# Altium schematic symbol library jlcpcb_2025_04_capacitors_extended_1210.schlib: 709 symbols (part 1 of 4) (continued)
## 12105C225KAT2A
designator C?  Capacitance: 2.2uF  (hidden comment: *)
Capacitor, Ceramic (MLCC), 2.2uF, ±10%, 50V, X7R, ±10%, SMD 1210; Manufacturer: AVX; Manufacturer Part Number: 12105C225KAT2A; Package Size: 1210; JLCPCB Basic Part: No; JLCPCB Part Number: C597581; Supplier 1: LCSC; Category: Capacitors - MLCC; Supplier Part Number 1: C597581; Tolerance: ±10%; Voltage Rating: 50V; Temperature Coefficient: X7R; RoHS: Yes; ComponentLink1Description: Datasheet; ComponentLink1URL: https://wmsc.lcsc.com/wmsc/upload/file/pdf/v2/lcsc/2304140030_Kyocera-AVX-12105C225KAT2A_C597581.pdf; ComponentLink2Description: JLCPCB Part URL; ComponentLink2URL: https://jlcpcb.com/partdetail/C597581; ComponentLink3Description: LCSC Part URL; ComponentLink3URL: https://lcsc.com/product-detail/Multilayer-Ceramic-Capacitors-MLCC---SMD-SMT_Kyocera-AVX-Kyocera-AVX-12105C225KAT2A_C597581.html
footprint CAP-1210 (1210 (3225M) Capacitor)
pins: 1, 2

## 12105C475KAT2A
designator C?  Capacitance: 4.7uF  (hidden comment: *)
Capacitor, Ceramic (MLCC), 4.7uF, ±10%, 50V, X7R, ±10%, SMD 1210; Manufacturer: AVX; Manufacturer Part Number: 12105C475KAT2A; Package Size: 1210; JLCPCB Basic Part: No; JLCPCB Part Number: C597589; Supplier 1: LCSC; Category: Capacitors - MLCC; Supplier Part Number 1: C597589; Tolerance: ±10%; Voltage Rating: 50V; Temperature Coefficient: X7R; RoHS: Yes; ComponentLink1Description: Datasheet; ComponentLink1URL: https://wmsc.lcsc.com/wmsc/upload/file/pdf/v2/lcsc/2304140030_Kyocera-AVX-12105C475KAT2A_C597589.pdf; ComponentLink2Description: JLCPCB Part URL; ComponentLink2URL: https://jlcpcb.com/partdetail/C597589; ComponentLink3Description: LCSC Part URL; ComponentLink3URL: https://lcsc.com/product-detail/Multilayer-Ceramic-Capacitors-MLCC---SMD-SMT_Kyocera-AVX-Kyocera-AVX-12105C475KAT2A_C597589.html
footprint CAP-1210 (1210 (3225M) Capacitor)
pins: 1, 2

## 12106D476KAT2A
designator C?  Capacitance: 47uF  (hidden comment: *)
Capacitor, Ceramic (MLCC), 47uF, ±10%, 6.3V, X5R, ±10%, SMD 1210; Manufacturer: AVX; Manufacturer Part Number: 12106D476KAT2A; Package Size: 1210; JLCPCB Basic Part: No; JLCPCB Part Number: C597592; Supplier 1: LCSC; Category: Capacitors - MLCC; Supplier Part Number 1: C597592; Tolerance: ±10%; Voltage Rating: 6.3V; Temperature Coefficient: X5R; RoHS: Yes; ComponentLink1Description: Datasheet; ComponentLink1URL: https://wmsc.lcsc.com/wmsc/upload/file/pdf/v2/lcsc/2304140030_Kyocera-AVX-12106D476KAT2A_C597592.pdf; ComponentLink2Description: JLCPCB Part URL; ComponentLink2URL: https://jlcpcb.com/partdetail/C597592; ComponentLink3Description: LCSC Part URL; ComponentLink3URL: https://lcsc.com/product-detail/Multilayer-Ceramic-Capacitors-MLCC---SMD-SMT_Kyocera-AVX-Kyocera-AVX-12106D476KAT2A_C597592.html
footprint CAP-1210 (1210 (3225M) Capacitor)
pins: 1, 2

## AC1210JKNPO9BN102
designator C?  Capacitance: 1nF  (hidden comment: *)
Capacitor, Ceramic (MLCC), 1nF, ±5%, 50V, NP0, ±5%, SMD 1210; Manufacturer: YAGEO; Manufacturer Part Number: AC1210JKNPO9BN102; Package Size: 1210; JLCPCB Basic Part: No; JLCPCB Part Number: C2173372; Supplier 1: LCSC; Category: Capacitors - MLCC; Supplier Part Number 1: C2173372; Tolerance: ±5%; Voltage Rating: 50V; Temperature Coefficient: NP0; RoHS: Yes; ComponentLink1Description: Datasheet; ComponentLink1URL: https://wmsc.lcsc.com/wmsc/upload/file/pdf/v2/lcsc/2202040630_YAGEO-AC1210JKNPO9BN102_C2173372.pdf; ComponentLink2Description: JLCPCB Part URL; ComponentLink2URL: https://jlcpcb.com/partdetail/C2173372; ComponentLink3Description: LCSC Part URL; ComponentLink3URL: https://lcsc.com/product-detail/Multilayer-Ceramic-Capacitors-MLCC---SMD-SMT_YAGEO-YAGEO-AC1210JKNPO9BN102_C2173372.html
footprint CAP-1210 (1210 (3225M) Capacitor)
pins: 1, 2

## AC1210JKNPOYBN102
designator C?  Capacitance: 1nF  (hidden comment: *)
Capacitor, Ceramic (MLCC), 1nF, ±5%, 250V, NP0, ±5%, SMD 1210; Manufacturer: YAGEO; Manufacturer Part Number: AC1210JKNPOYBN102; Package Size: 1210; JLCPCB Basic Part: No; JLCPCB Part Number: C2179434; Supplier 1: LCSC; Category: Capacitors - MLCC; Supplier Part Number 1: C2179434; Tolerance: ±5%; Voltage Rating: 250V; Temperature Coefficient: NP0; RoHS: Yes; ComponentLink1Description: Datasheet; ComponentLink1URL: https://wmsc.lcsc.com/wmsc/upload/file/pdf/v2/lcsc/2202041030_YAGEO-AC1210JKNPOYBN102_C2179434.pdf; ComponentLink2Description: JLCPCB Part URL; ComponentLink2URL: https://jlcpcb.com/partdetail/C2179434; ComponentLink3Description: LCSC Part URL; ComponentLink3URL: https://lcsc.com/product-detail/Multilayer-Ceramic-Capacitors-MLCC---SMD-SMT_YAGEO-YAGEO-AC1210JKNPOYBN102_C2179434.html
footprint CAP-1210 (1210 (3225M) Capacitor)
pins: 1, 2

## AC1210KKX7R0BB104
designator C?  Capacitance: 100nF  (hidden comment: *)
Capacitor, Ceramic (MLCC), 100nF, ±10%, 100V, X7R, ±10%, SMD 1210; Manufacturer: YAGEO; Manufacturer Part Number: AC1210KKX7R0BB104; Package Size: 1210; JLCPCB Basic Part: No; JLCPCB Part Number: C3861426; Supplier 1: LCSC; Category: Capacitors - MLCC; Supplier Part Number 1: C3861426; Tolerance: ±10%; Voltage Rating: 100V; Temperature Coefficient: X7R; RoHS: Yes; ComponentLink1Description: Datasheet; ComponentLink1URL: https://wmsc.lcsc.com/wmsc/upload/file/pdf/v2/lcsc/2311211113_YAGEO-AC1210KKX7R0BB104_C3861426.pdf; ComponentLink2Description: JLCPCB Part URL; ComponentLink2URL: https://jlcpcb.com/partdetail/C3861426; ComponentLink3Description: LCSC Part URL; ComponentLink3URL: https://lcsc.com/product-detail/Multilayer-Ceramic-Capacitors-MLCC---SMD-SMT_YAGEO-YAGEO-AC1210KKX7R0BB104_C3861426.html
footprint CAP-1210 (1210 (3225M) Capacitor)
pins: 1, 2

## AC1210KKX7R9BB474
designator C?  Capacitance: 470nF  (hidden comment: *)
Capacitor, Ceramic (MLCC), 470nF, ±10%, 50V, X7R, ±10%, SMD 1210; Manufacturer: YAGEO; Manufacturer Part Number: AC1210KKX7R9BB474; Package Size: 1210; JLCPCB Basic Part: No; JLCPCB Part Number: C2173617; Supplier 1: LCSC; Category: Capacitors - MLCC; Supplier Part Number 1: C2173617; Tolerance: ±10%; Voltage Rating: 50V; Temperature Coefficient: X7R; RoHS: Yes; ComponentLink1Description: Datasheet; ComponentLink1URL: https://wmsc.lcsc.com/wmsc/upload/file/pdf/v2/lcsc/2202040630_YAGEO-AC1210KKX7R9BB474_C2173617.pdf; ComponentLink2Description: JLCPCB Part URL; ComponentLink2URL: https://jlcpcb.com/partdetail/C2173617; ComponentLink3Description: LCSC Part URL; ComponentLink3URL: https://lcsc.com/product-detail/Multilayer-Ceramic-Capacitors-MLCC---SMD-SMT_YAGEO-YAGEO-AC1210KKX7R9BB474_C2173617.html
footprint CAP-1210 (1210 (3225M) Capacitor)
pins: 1, 2

## AC1210KKX7R9BB475
designator C?  Capacitance: 4.7uF  (hidden comment: *)
Capacitor, Ceramic (MLCC), 4.7uF, ±10%, 50V, X7R, ±10%, SMD 1210; Manufacturer: YAGEO; Manufacturer Part Number: AC1210KKX7R9BB475; Package Size: 1210; JLCPCB Basic Part: No; JLCPCB Part Number: C2935250; Supplier 1: LCSC; Category: Capacitors - MLCC; Supplier Part Number 1: C2935250; Tolerance: ±10%; Voltage Rating: 50V; Temperature Coefficient: X7R; RoHS: Yes; ComponentLink1Description: Datasheet; ComponentLink1URL: https://wmsc.lcsc.com/wmsc/upload/file/pdf/v2/lcsc/2203101903_YAGEO-AC1210KKX7R9BB475_C2935250.pdf; ComponentLink2Description: JLCPCB Part URL; ComponentLink2URL: https://jlcpcb.com/partdetail/C2935250; ComponentLink3Description: LCSC Part URL; ComponentLink3URL: https://lcsc.com/product-detail/Multilayer-Ceramic-Capacitors-MLCC---SMD-SMT_YAGEO-YAGEO-AC1210KKX7R9BB475_C2935250.html
footprint CAP-1210 (1210 (3225M) Capacitor)
pins: 1, 2

## AS1210KKX7R9BB475
designator C?  Capacitance: 4.7uF  (hidden comment: *)
Capacitor, Ceramic (MLCC), 4.7uF, ±10%, 50V, X7R, ±10%, SMD 1210; Manufacturer: YAGEO; Manufacturer Part Number: AS1210KKX7R9BB475; Package Size: 1210; JLCPCB Basic Part: No; JLCPCB Part Number: C2168507; Supplier 1: LCSC; Category: Capacitors - MLCC; Supplier Part Number 1: C2168507; Tolerance: ±10%; Voltage Rating: 50V; Temperature Coefficient: X7R; RoHS: Yes; ComponentLink1Description: Datasheet; ComponentLink1URL: https://wmsc.lcsc.com/wmsc/upload/file/pdf/v2/lcsc/2202040300_YAGEO-AS1210KKX7R9BB475_C2168507.pdf; ComponentLink2Description: JLCPCB Part URL; ComponentLink2URL: https://jlcpcb.com/partdetail/C2168507; ComponentLink3Description: LCSC Part URL; ComponentLink3URL: https://lcsc.com/product-detail/Multilayer-Ceramic-Capacitors-MLCC---SMD-SMT_YAGEO-YAGEO-AS1210KKX7R9BB475_C2168507.html
footprint CAP-1210 (1210 (3225M) Capacitor)
pins: 1, 2

## C1210B106K025T
designator C?  Capacitance: 10uF  (hidden comment: *)
Capacitor, Ceramic (MLCC), 10uF, ±10%, 25V, X5R, ±10%, SMD 1210; Manufacturer: IHHEC(HOLY STONE ENTERPRISE CO., LTD); Manufacturer Part Number: C1210B106K025T; Package Size: 1210; JLCPCB Basic Part: No; JLCPCB Part Number: C106092; Supplier 1: LCSC; Category: Capacitors - MLCC; Supplier Part Number 1: C106092; Tolerance: ±10%; Voltage Rating: 25V; Temperature Coefficient: X5R; RoHS: Yes; ComponentLink1Description: Datasheet; ComponentLink1URL: https://wmsc.lcsc.com/wmsc/upload/file/pdf/v2/lcsc/2304140030_IHHEC-HOLY-STONE-ENTERPRISE-CO---LTD-C1210B106K025T_C106092.pdf; ComponentLink2Description: JLCPCB Part URL; ComponentLink2URL: https://jlcpcb.com/partdetail/C106092; ComponentLink3Description: LCSC Part URL; ComponentLink3URL: https://lcsc.com/product-detail/Multilayer-Ceramic-Capacitors-MLCC---SMD-SMT_IHHECHOLY-STONE-ENTERPRISE-CO.%2C-LTD-IHHECHOLY-STONE-ENTERPRISE-CO.%2C-LTD-C1210B106K025T_C106092.html
footprint CAP-1210 (1210 (3225M) Capacitor)
pins: 1, 2

## C1210C104KCRAC7800
designator C?  Capacitance: 100nF  (hidden comment: *)
Capacitor, Ceramic (MLCC), 100nF, ±10%, 500V, X7R, ±10%, SMD 1210; Manufacturer: KEMET; Manufacturer Part Number: C1210C104KCRAC7800; Package Size: 1210; JLCPCB Basic Part: No; JLCPCB Part Number: C141218; Supplier 1: LCSC; Category: Capacitors - MLCC; Supplier Part Number 1: C141218; Tolerance: ±10%; Voltage Rating: 500V; Temperature Coefficient: X7R; RoHS: Yes; ComponentLink1Description: Datasheet; ComponentLink1URL: https://wmsc.lcsc.com/wmsc/upload/file/pdf/v2/lcsc/1809031721_KEMET-C1210C104KCRAC7800_C141218.pdf; ComponentLink2Description: JLCPCB Part URL; ComponentLink2URL: https://jlcpcb.com/partdetail/C141218; ComponentLink3Description: LCSC Part URL; ComponentLink3URL: https://lcsc.com/product-detail/Multilayer-Ceramic-Capacitors-MLCC---SMD-SMT_KEMET-KEMET-C1210C104KCRAC7800_C141218.html
footprint CAP-1210 (1210 (3225M) Capacitor)
pins: 1, 2

## C1210C105K1RACAUTO
designator C?  Capacitance: 1uF  (hidden comment: *)
Capacitor, Ceramic (MLCC), 1uF, ±10%, 100V, X7R, ±10%, SMD 1210; Manufacturer: KEMET; Manufacturer Part Number: C1210C105K1RACAUTO; Package Size: 1210; JLCPCB Basic Part: No; JLCPCB Part Number: C129676; Supplier 1: LCSC; Category: Capacitors - MLCC; Supplier Part Number 1: C129676; Tolerance: ±10%; Voltage Rating: 100V; Temperature Coefficient: X7R; RoHS: Yes; ComponentLink1Description: Datasheet; ComponentLink1URL: https://wmsc.lcsc.com/wmsc/upload/file/pdf/v2/lcsc/2304140030_KEMET-C1210C105K1RACAUTO_C129676.pdf; ComponentLink2Description: JLCPCB Part URL; ComponentLink2URL: https://jlcpcb.com/partdetail/C129676; ComponentLink3Description: LCSC Part URL; ComponentLink3URL: https://lcsc.com/product-detail/Multilayer-Ceramic-Capacitors-MLCC---SMD-SMT_KEMET-KEMET-C1210C105K1RACAUTO_C129676.html
footprint CAP-1210 (1210 (3225M) Capacitor)
pins: 1, 2

## C1210C105K5RAC7800
designator C?  Capacitance: 1uF  (hidden comment: *)
Capacitor, Ceramic (MLCC), 1uF, ±10%, 50V, X7R, ±10%, SMD 1210; Manufacturer: KEMET; Manufacturer Part Number: C1210C105K5RAC7800; Package Size: 1210; JLCPCB Basic Part: No; JLCPCB Part Number: C141220; Supplier 1: LCSC; Category: Capacitors - MLCC; Supplier Part Number 1: C141220; Tolerance: ±10%; Voltage Rating: 50V; Temperature Coefficient: X7R; RoHS: Yes; ComponentLink1Description: Datasheet; ComponentLink1URL: https://wmsc.lcsc.com/wmsc/upload/file/pdf/v2/lcsc/2304140030_KEMET-C1210C105K5RAC7800_C141220.pdf; ComponentLink2Description: JLCPCB Part URL; ComponentLink2URL: https://jlcpcb.com/partdetail/C141220; ComponentLink3Description: LCSC Part URL; ComponentLink3URL: https://lcsc.com/product-detail/Multilayer-Ceramic-Capacitors-MLCC---SMD-SMT_KEMET-KEMET-C1210C105K5RAC7800_C141220.html
footprint CAP-1210 (1210 (3225M) Capacitor)
pins: 1, 2

## C1210C106K3RACAUTO
designator C?  Capacitance: 10uF  (hidden comment: *)
Capacitor, Ceramic (MLCC), 10uF, ±10%, 25V, X7R, ±10%, SMD 1210; Manufacturer: KEMET; Manufacturer Part Number: C1210C106K3RACAUTO; Package Size: 1210; JLCPCB Basic Part: No; JLCPCB Part Number: C129691; Supplier 1: LCSC; Category: Capacitors - MLCC; Supplier Part Number 1: C129691; Tolerance: ±10%; Voltage Rating: 25V; Temperature Coefficient: X7R; RoHS: Yes; ComponentLink1Description: Datasheet; ComponentLink1URL: https://wmsc.lcsc.com/wmsc/upload/file/pdf/v2/lcsc/1804242310_KEMET-C1210C106K3RACAUTO_C129691.pdf; ComponentLink2Description: JLCPCB Part URL; ComponentLink2URL: https://jlcpcb.com/partdetail/C129691; ComponentLink3Description: LCSC Part URL; ComponentLink3URL: https://lcsc.com/product-detail/Multilayer-Ceramic-Capacitors-MLCC---SMD-SMT_KEMET-KEMET-C1210C106K3RACAUTO_C129691.html
footprint CAP-1210 (1210 (3225M) Capacitor)
pins: 1, 2

## C1210C222JDGACAUTO
designator C?  Capacitance: 2.2nF  (hidden comment: *)
Capacitor, Ceramic (MLCC), 2.2nF, ±5%, 1kV, C0G, ±5%, SMD 1210; Manufacturer: KEMET; Manufacturer Part Number: C1210C222JDGACAUTO; Package Size: 1210; JLCPCB Basic Part: No; JLCPCB Part Number: C2181686; Supplier 1: LCSC; Category: Capacitors - MLCC; Supplier Part Number 1: C2181686; Tolerance: ±5%; Voltage Rating: 1kV; Temperature Coefficient: C0G; RoHS: Yes; ComponentLink1Description: Datasheet; ComponentLink1URL: https://wmsc.lcsc.com/wmsc/upload/file/pdf/v2/lcsc/2304140030_KEMET-C1210C222JDGACAUTO_C2181686.pdf; ComponentLink2Description: JLCPCB Part URL; ComponentLink2URL: https://jlcpcb.com/partdetail/C2181686; ComponentLink3Description: LCSC Part URL; ComponentLink3URL: https://lcsc.com/product-detail/Multilayer-Ceramic-Capacitors-MLCC---SMD-SMT_KEMET-KEMET-C1210C222JDGACAUTO_C2181686.html
footprint CAP-1210 (1210 (3225M) Capacitor)
pins: 1, 2

## C1210C224K5RACTU
designator C?  Capacitance: 220nF  (hidden comment: *)
Capacitor, Ceramic (MLCC), 220nF, ±10%, 50V, X7R, ±10%, SMD 1210; Manufacturer: KEMET; Manufacturer Part Number: C1210C224K5RACTU; Package Size: 1210; JLCPCB Basic Part: No; JLCPCB Part Number: C452758; Supplier 1: LCSC; Category: Capacitors - MLCC; Supplier Part Number 1: C452758; Tolerance: ±10%; Voltage Rating: 50V; Temperature Coefficient: X7R; RoHS: Yes; ComponentLink1Description: Datasheet; ComponentLink1URL: https://wmsc.lcsc.com/wmsc/upload/file/pdf/v2/lcsc/2304140030_KEMET-C1210C224K5RACTU_C452758.pdf; ComponentLink2Description: JLCPCB Part URL; ComponentLink2URL: https://jlcpcb.com/partdetail/C452758; ComponentLink3Description: LCSC Part URL; ComponentLink3URL: https://lcsc.com/product-detail/Multilayer-Ceramic-Capacitors-MLCC---SMD-SMT_KEMET-KEMET-C1210C224K5RACTU_C452758.html
footprint CAP-1210 (1210 (3225M) Capacitor)
pins: 1, 2

## C1210C225K1RACAUTO
designator C?  Capacitance: 2.2uF  (hidden comment: *)
Capacitor, Ceramic (MLCC), 2.2uF, ±10%, 100V, X7R, ±10%, SMD 1210; Manufacturer: KEMET; Manufacturer Part Number: C1210C225K1RACAUTO; Package Size: 1210; JLCPCB Basic Part: No; JLCPCB Part Number: C561798; Supplier 1: LCSC; Category: Capacitors - MLCC; Supplier Part Number 1: C561798; Tolerance: ±10%; Voltage Rating: 100V; Temperature Coefficient: X7R; RoHS: Yes; ComponentLink1Description: Datasheet; ComponentLink1URL: https://wmsc.lcsc.com/wmsc/upload/file/pdf/v2/lcsc/2304140030_KEMET-C1210C225K1RACAUTO_C561798.pdf; ComponentLink2Description: JLCPCB Part URL; ComponentLink2URL: https://jlcpcb.com/partdetail/C561798; ComponentLink3Description: LCSC Part URL; ComponentLink3URL: https://lcsc.com/product-detail/Multilayer-Ceramic-Capacitors-MLCC---SMD-SMT_KEMET-KEMET-C1210C225K1RACAUTO_C561798.html
footprint CAP-1210 (1210 (3225M) Capacitor)
pins: 1, 2

## C1210C225K5RACAUTO
designator C?  Capacitance: 2.2uF  (hidden comment: *)
Capacitor, Ceramic (MLCC), 2.2uF, ±10%, 50V, X7R, ±10%, SMD 1210; Manufacturer: KEMET; Manufacturer Part Number: C1210C225K5RACAUTO; Package Size: 1210; JLCPCB Basic Part: No; JLCPCB Part Number: C129678; Supplier 1: LCSC; Category: Capacitors - MLCC; Supplier Part Number 1: C129678; Tolerance: ±10%; Voltage Rating: 50V; Temperature Coefficient: X7R; RoHS: Yes; ComponentLink1Description: Datasheet; ComponentLink1URL: https://wmsc.lcsc.com/wmsc/upload/file/pdf/v2/lcsc/1810121647_KEMET-C1210C225K5RACAUTO_C129678.pdf; ComponentLink2Description: JLCPCB Part URL; ComponentLink2URL: https://jlcpcb.com/partdetail/C129678; ComponentLink3Description: LCSC Part URL; ComponentLink3URL: https://lcsc.com/product-detail/Multilayer-Ceramic-Capacitors-MLCC---SMD-SMT_KEMET-KEMET-C1210C225K5RACAUTO_C129678.html
footprint CAP-1210 (1210 (3225M) Capacitor)
pins: 1, 2

## C1210C226K3RAC7800
designator C?  Capacitance: 22uF  (hidden comment: *)
Capacitor, Ceramic (MLCC), 22uF, ±10%, 25V, X7R, ±10%, SMD 1210; Manufacturer: KEMET; Manufacturer Part Number: C1210C226K3RAC7800; Package Size: 1210; JLCPCB Basic Part: No; JLCPCB Part Number: C696378; Supplier 1: LCSC; Category: Capacitors - MLCC; Supplier Part Number 1: C696378; Tolerance: ±10%; Voltage Rating: 25V; Temperature Coefficient: X7R; RoHS: Yes; ComponentLink1Description: Datasheet; ComponentLink1URL: https://wmsc.lcsc.com/wmsc/upload/file/pdf/v2/lcsc/2008131833_KEMET-C1210C226K3RAC7800_C696378.pdf; ComponentLink2Description: JLCPCB Part URL; ComponentLink2URL: https://jlcpcb.com/partdetail/C696378; ComponentLink3Description: LCSC Part URL; ComponentLink3URL: https://lcsc.com/product-detail/Multilayer-Ceramic-Capacitors-MLCC---SMD-SMT_KEMET-KEMET-C1210C226K3RAC7800_C696378.html
footprint CAP-1210 (1210 (3225M) Capacitor)
pins: 1, 2

## C1210C226K4PAC7800
designator C?  Capacitance: 22uF  (hidden comment: *)
Capacitor, Ceramic (MLCC), 22uF, ±10%, 16V, X5R, ±10%, SMD 1210; Manufacturer: KEMET; Manufacturer Part Number: C1210C226K4PAC7800; Package Size: 1210; JLCPCB Basic Part: No; JLCPCB Part Number: C141048; Supplier 1: LCSC; Category: Capacitors - MLCC; Supplier Part Number 1: C141048; Tolerance: ±10%; Voltage Rating: 16V; Temperature Coefficient: X5R; RoHS: Yes; ComponentLink1Description: Datasheet; ComponentLink1URL: https://wmsc.lcsc.com/wmsc/upload/file/pdf/v2/lcsc/2304140030_KEMET-C1210C226K4PAC7800_C141048.pdf; ComponentLink2Description: JLCPCB Part URL; ComponentLink2URL: https://jlcpcb.com/partdetail/C141048; ComponentLink3Description: LCSC Part URL; ComponentLink3URL: https://lcsc.com/product-detail/Multilayer-Ceramic-Capacitors-MLCC---SMD-SMT_KEMET-KEMET-C1210C226K4PAC7800_C141048.html
footprint CAP-1210 (1210 (3225M) Capacitor)
pins: 1, 2

## C1210C226K8RACAUTO
designator C?  Capacitance: 22uF  (hidden comment: *)
Capacitor, Ceramic (MLCC), 22uF, ±10%, 10V, X7R, ±10%, SMD 1210; Manufacturer: KEMET; Manufacturer Part Number: C1210C226K8RACAUTO; Package Size: 1210; JLCPCB Basic Part: No; JLCPCB Part Number: C561843; Supplier 1: LCSC; Category: Capacitors - MLCC; Supplier Part Number 1: C561843; Tolerance: ±10%; Voltage Rating: 10V; Temperature Coefficient: X7R; RoHS: Yes; ComponentLink1Description: Datasheet; ComponentLink1URL: https://wmsc.lcsc.com/wmsc/upload/file/pdf/v2/lcsc/2304140030_KEMET-C1210C226K8RACAUTO_C561843.pdf; ComponentLink2Description: JLCPCB Part URL; ComponentLink2URL: https://jlcpcb.com/partdetail/C561843; ComponentLink3Description: LCSC Part URL; ComponentLink3URL: https://lcsc.com/product-detail/Multilayer-Ceramic-Capacitors-MLCC---SMD-SMT_KEMET-KEMET-C1210C226K8RACAUTO_C561843.html
footprint CAP-1210 (1210 (3225M) Capacitor)
pins: 1, 2

## C1210C335K5RACAUTO
designator C?  Capacitance: 3.3uF  (hidden comment: *)
Capacitor, Ceramic (MLCC), 3.3uF, ±10%, 50V, X7R, ±10%, SMD 1210; Manufacturer: KEMET; Manufacturer Part Number: C1210C335K5RACAUTO; Package Size: 1210; JLCPCB Basic Part: No; JLCPCB Part Number: C3855810; Supplier 1: LCSC; Category: Capacitors - MLCC; Supplier Part Number 1: C3855810; Tolerance: ±10%; Voltage Rating: 50V; Temperature Coefficient: X7R; RoHS: Yes; ComponentLink1Description: Datasheet; ComponentLink1URL: https://wmsc.lcsc.com/wmsc/upload/file/pdf/v2/lcsc/2401181625_KEMET-C1210C335K5RACAUTO_C3855810.pdf; ComponentLink2Description: JLCPCB Part URL; ComponentLink2URL: https://jlcpcb.com/partdetail/C3855810; ComponentLink3Description: LCSC Part URL; ComponentLink3URL: https://lcsc.com/product-detail/Multilayer-Ceramic-Capacitors-MLCC---SMD-SMT_KEMET-KEMET-C1210C335K5RACAUTO_C3855810.html
footprint CAP-1210 (1210 (3225M) Capacitor)
pins: 1, 2

## C1210C475K5RACAUTO
designator C?  Capacitance: 4.7uF  (hidden comment: *)
Capacitor, Ceramic (MLCC), 4.7uF, ±10%, 50V, X7R, ±10%, SMD 1210; Manufacturer: KEMET; Manufacturer Part Number: C1210C475K5RACAUTO; Package Size: 1210; JLCPCB Basic Part: No; JLCPCB Part Number: C141229; Supplier 1: LCSC; Category: Capacitors - MLCC; Supplier Part Number 1: C141229; Tolerance: ±10%; Voltage Rating: 50V; Temperature Coefficient: X7R; RoHS: Yes; ComponentLink1Description: Datasheet; ComponentLink1URL: https://wmsc.lcsc.com/wmsc/upload/file/pdf/v2/lcsc/1809131620_KEMET-C1210C475K5RACAUTO_C141229.pdf; ComponentLink2Description: JLCPCB Part URL; ComponentLink2URL: https://jlcpcb.com/partdetail/C141229; ComponentLink3Description: LCSC Part URL; ComponentLink3URL: https://lcsc.com/product-detail/Multilayer-Ceramic-Capacitors-MLCC---SMD-SMT_KEMET-KEMET-C1210C475K5RACAUTO_C141229.html
footprint CAP-1210 (1210 (3225M) Capacitor)
pins: 1, 2

## C1210N101J202T
designator C?  Capacitance: 100pF  (hidden comment: *)
Capacitor, Ceramic (MLCC), 100pF, ±5%, 2kV, C0G, ±5%, SMD 1210; Manufacturer: IHHEC(HOLY STONE ENTERPRISE CO., LTD); Manufacturer Part Number: C1210N101J202T; Package Size: 1210; JLCPCB Basic Part: No; JLCPCB Part Number: C106093; Supplier 1: LCSC; Category: Capacitors - MLCC; Supplier Part Number 1: C106093; Tolerance: ±5%; Voltage Rating: 2kV; Temperature Coefficient: C0G; RoHS: Yes; ComponentLink1Description: Datasheet; ComponentLink1URL: https://wmsc.lcsc.com/wmsc/upload/file/pdf/v2/lcsc/2304140030_IHHEC-HOLY-STONE-ENTERPRISE-CO---LTD-C1210N101J202T_C106093.pdf; ComponentLink2Description: JLCPCB Part URL; ComponentLink2URL: https://jlcpcb.com/partdetail/C106093; ComponentLink3Description: LCSC Part URL; ComponentLink3URL: https://lcsc.com/product-detail/Multilayer-Ceramic-Capacitors-MLCC---SMD-SMT_IHHECHOLY-STONE-ENTERPRISE-CO.%2C-LTD-IHHECHOLY-STONE-ENTERPRISE-CO.%2C-LTD-C1210N101J202T_C106093.html
footprint CAP-1210 (1210 (3225M) Capacitor)
pins: 1, 2

## C1210N102J102T
designator C?  Capacitance: 1nF  (hidden comment: *)
Capacitor, Ceramic (MLCC), 1nF, ±5%, 1kV, ±5%, SMD 1210; Manufacturer: IHHEC(HOLY STONE ENTERPRISE CO., LTD); Manufacturer Part Number: C1210N102J102T; Package Size: 1210; JLCPCB Basic Part: No; JLCPCB Part Number: C961531; Supplier 1: LCSC; Category: Capacitors - MLCC; Supplier Part Number 1: C961531; Tolerance: ±5%; Voltage Rating: 1kV; RoHS: Yes; ComponentLink1Description: Datasheet; ComponentLink1URL: https://wmsc.lcsc.com/wmsc/upload/file/pdf/v2/lcsc/2304140030_IHHEC-HOLY-STONE-ENTERPRISE-CO---LTD-C1210N102J102T_C961531.pdf; ComponentLink2Description: JLCPCB Part URL; ComponentLink2URL: https://jlcpcb.com/partdetail/C961531; ComponentLink3Description: LCSC Part URL; ComponentLink3URL: https://lcsc.com/product-detail/Multilayer-Ceramic-Capacitors-MLCC---SMD-SMT_IHHECHOLY-STONE-ENTERPRISE-CO.%2C-LTD-IHHECHOLY-STONE-ENTERPRISE-CO.%2C-LTD-C1210N102J102T_C961531.html
footprint CAP-1210 (1210 (3225M) Capacitor)
pins: 1, 2

## C1210N103K050T
designator C?  Capacitance: 10nF  (hidden comment: *)
Capacitor, Ceramic (MLCC), 10nF, ±10%, 50V, ±10%, SMD 1210; Manufacturer: IHHEC(HOLY STONE ENTERPRISE CO., LTD); Manufacturer Part Number: C1210N103K050T; Package Size: 1210; JLCPCB Basic Part: No; JLCPCB Part Number: C961532; Supplier 1: LCSC; Category: Capacitors - MLCC; Supplier Part Number 1: C961532; Tolerance: ±10%; Voltage Rating: 50V; RoHS: Yes; ComponentLink1Description: Datasheet; ComponentLink1URL: https://wmsc.lcsc.com/wmsc/upload/file/pdf/v2/lcsc/2304140030_IHHEC-HOLY-STONE-ENTERPRISE-CO---LTD-C1210N103K050T_C961532.pdf; ComponentLink2Description: JLCPCB Part URL; ComponentLink2URL: https://jlcpcb.com/partdetail/C961532; ComponentLink3Description: LCSC Part URL; ComponentLink3URL: https://lcsc.com/product-detail/Multilayer-Ceramic-Capacitors-MLCC---SMD-SMT_IHHECHOLY-STONE-ENTERPRISE-CO.%2C-LTD-IHHECHOLY-STONE-ENTERPRISE-CO.%2C-LTD-C1210N103K050T_C961532.html
footprint CAP-1210 (1210 (3225M) Capacitor)
pins: 1, 2

## C1210N223J050T
designator C?  Capacitance: 22nF  (hidden comment: *)
Capacitor, Ceramic (MLCC), 22nF, ±5%, 50V, NP0, ±5%, SMD 1210; Manufacturer: IHHEC(HOLY STONE ENTERPRISE CO., LTD); Manufacturer Part Number: C1210N223J050T; Package Size: 1210; JLCPCB Basic Part: No; JLCPCB Part Number: C961533; Supplier 1: LCSC; Category: Capacitors - MLCC; Supplier Part Number 1: C961533; Tolerance: ±5%; Voltage Rating: 50V; Temperature Coefficient: NP0; RoHS: Yes; ComponentLink1Description: Datasheet; ComponentLink1URL: https://wmsc.lcsc.com/wmsc/upload/file/pdf/v2/lcsc/2304140030_IHHEC-HOLY-STONE-ENTERPRISE-CO---LTD-C1210N223J050T_C961533.pdf; ComponentLink2Description: JLCPCB Part URL; ComponentLink2URL: https://jlcpcb.com/partdetail/C961533; ComponentLink3Description: LCSC Part URL; ComponentLink3URL: https://lcsc.com/product-detail/Multilayer-Ceramic-Capacitors-MLCC---SMD-SMT_IHHECHOLY-STONE-ENTERPRISE-CO.%2C-LTD-IHHECHOLY-STONE-ENTERPRISE-CO.%2C-LTD-C1210N223J050T_C961533.html
footprint CAP-1210 (1210 (3225M) Capacitor)
pins: 1, 2

## C1210N223K050T
designator C?  Capacitance: 22nF  (hidden comment: *)
Capacitor, Ceramic (MLCC), 22nF, ±10%, 50V, NP0, ±10%, SMD 1210; Manufacturer: IHHEC(HOLY STONE ENTERPRISE CO., LTD); Manufacturer Part Number: C1210N223K050T; Package Size: 1210; JLCPCB Basic Part: No; JLCPCB Part Number: C106094; Supplier 1: LCSC; Category: Capacitors - MLCC; Supplier Part Number 1: C106094; Tolerance: ±10%; Voltage Rating: 50V; Temperature Coefficient: NP0; RoHS: Yes; ComponentLink1Description: Datasheet; ComponentLink1URL: https://wmsc.lcsc.com/wmsc/upload/file/pdf/v2/lcsc/2304140030_IHHEC-HOLY-STONE-ENTERPRISE-CO---LTD-C1210N223K050T_C106094.pdf; ComponentLink2Description: JLCPCB Part URL; ComponentLink2URL: https://jlcpcb.com/partdetail/C106094; ComponentLink3Description: LCSC Part URL; ComponentLink3URL: https://lcsc.com/product-detail/Multilayer-Ceramic-Capacitors-MLCC---SMD-SMT_IHHECHOLY-STONE-ENTERPRISE-CO.%2C-LTD-IHHECHOLY-STONE-ENTERPRISE-CO.%2C-LTD-C1210N223K050T_C106094.html
footprint CAP-1210 (1210 (3225M) Capacitor)
pins: 1, 2

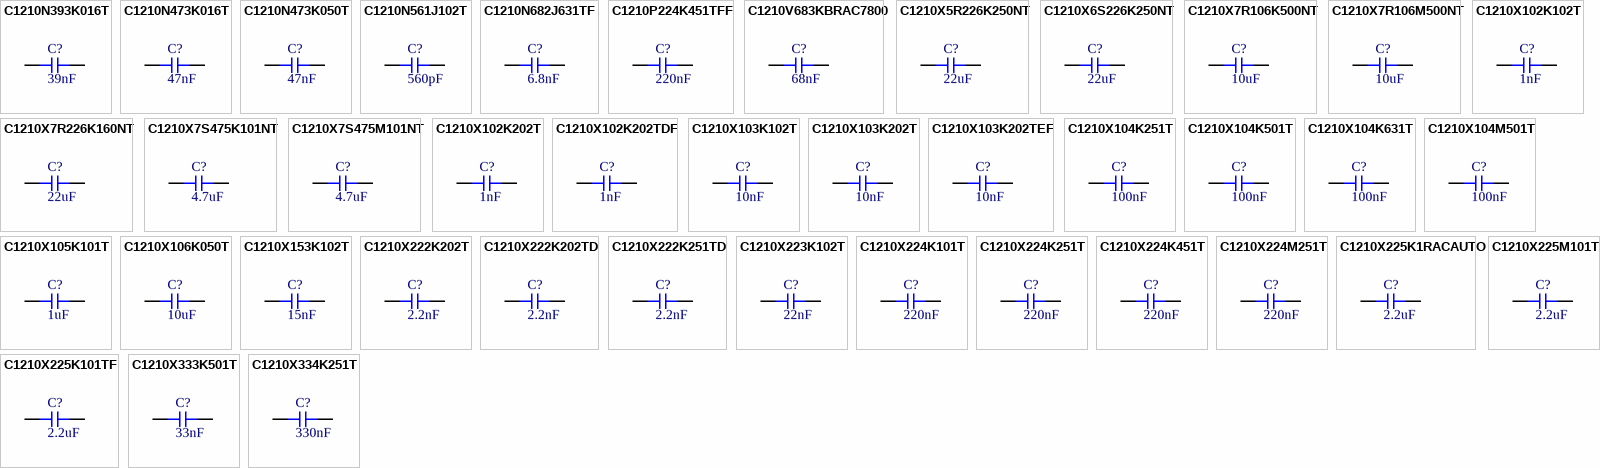
[diagram p4: symbols C1210N393K016T to C1210X334K251T]

## C1210N393K016T
designator C?  Capacitance: 39nF  (hidden comment: *)
Capacitor, Ceramic (MLCC), 39nF, ±10%, 16V, NP0, ±10%, SMD 1210; Manufacturer: IHHEC(HOLY STONE ENTERPRISE CO., LTD); Manufacturer Part Number: C1210N393K016T; Package Size: 1210; JLCPCB Basic Part: No; JLCPCB Part Number: C106095; Supplier 1: LCSC; Category: Capacitors - MLCC; Supplier Part Number 1: C106095; Tolerance: ±10%; Voltage Rating: 16V; Temperature Coefficient: NP0; RoHS: Yes; ComponentLink1Description: Datasheet; ComponentLink1URL: https://wmsc.lcsc.com/wmsc/upload/file/pdf/v2/lcsc/2304140030_IHHEC-HOLY-STONE-ENTERPRISE-CO---LTD-C1210N393K016T_C106095.pdf; ComponentLink2Description: JLCPCB Part URL; ComponentLink2URL: https://jlcpcb.com/partdetail/C106095; ComponentLink3Description: LCSC Part URL; ComponentLink3URL: https://lcsc.com/product-detail/Multilayer-Ceramic-Capacitors-MLCC---SMD-SMT_IHHECHOLY-STONE-ENTERPRISE-CO.%2C-LTD-IHHECHOLY-STONE-ENTERPRISE-CO.%2C-LTD-C1210N393K016T_C106095.html
footprint CAP-1210 (1210 (3225M) Capacitor)
pins: 1, 2

## C1210N473K016T
designator C?  Capacitance: 47nF  (hidden comment: *)
Capacitor, Ceramic (MLCC), 47nF, ±10%, 16V, NP0, ±10%, SMD 1210; Manufacturer: IHHEC(HOLY STONE ENTERPRISE CO., LTD); Manufacturer Part Number: C1210N473K016T; Package Size: 1210; JLCPCB Basic Part: No; JLCPCB Part Number: C106096; Supplier 1: LCSC; Category: Capacitors - MLCC; Supplier Part Number 1: C106096; Tolerance: ±10%; Voltage Rating: 16V; Temperature Coefficient: NP0; RoHS: Yes; ComponentLink1Description: Datasheet; ComponentLink1URL: https://wmsc.lcsc.com/wmsc/upload/file/pdf/v2/lcsc/2304140030_IHHEC-HOLY-STONE-ENTERPRISE-CO---LTD-C1210N473K016T_C106096.pdf; ComponentLink2Description: JLCPCB Part URL; ComponentLink2URL: https://jlcpcb.com/partdetail/C106096; ComponentLink3Description: LCSC Part URL; ComponentLink3URL: https://lcsc.com/product-detail/Multilayer-Ceramic-Capacitors-MLCC---SMD-SMT_IHHECHOLY-STONE-ENTERPRISE-CO.%2C-LTD-IHHECHOLY-STONE-ENTERPRISE-CO.%2C-LTD-C1210N473K016T_C106096.html
footprint CAP-1210 (1210 (3225M) Capacitor)
pins: 1, 2

## C1210N473K050T
designator C?  Capacitance: 47nF  (hidden comment: *)
Capacitor, Ceramic (MLCC), 47nF, ±10%, 50V, NP0, ±10%, SMD 1210; Manufacturer: IHHEC(HOLY STONE ENTERPRISE CO., LTD); Manufacturer Part Number: C1210N473K050T; Package Size: 1210; JLCPCB Basic Part: No; JLCPCB Part Number: C106097; Supplier 1: LCSC; Category: Capacitors - MLCC; Supplier Part Number 1: C106097; Tolerance: ±10%; Voltage Rating: 50V; Temperature Coefficient: NP0; RoHS: Yes; ComponentLink1Description: Datasheet; ComponentLink1URL: https://wmsc.lcsc.com/wmsc/upload/file/pdf/v2/lcsc/2304140030_IHHEC-HOLY-STONE-ENTERPRISE-CO---LTD-C1210N473K050T_C106097.pdf; ComponentLink2Description: JLCPCB Part URL; ComponentLink2URL: https://jlcpcb.com/partdetail/C106097; ComponentLink3Description: LCSC Part URL; ComponentLink3URL: https://lcsc.com/product-detail/Multilayer-Ceramic-Capacitors-MLCC---SMD-SMT_IHHECHOLY-STONE-ENTERPRISE-CO.%2C-LTD-IHHECHOLY-STONE-ENTERPRISE-CO.%2C-LTD-C1210N473K050T_C106097.html
footprint CAP-1210 (1210 (3225M) Capacitor)
pins: 1, 2

## C1210N561J102T
designator C?  Capacitance: 560pF  (hidden comment: *)
Capacitor, Ceramic (MLCC), 560pF, ±5%, 1kV, C0G, ±5%, SMD 1210; Manufacturer: IHHEC(HOLY STONE ENTERPRISE CO., LTD); Manufacturer Part Number: C1210N561J102T; Package Size: 1210; JLCPCB Basic Part: No; JLCPCB Part Number: C106099; Supplier 1: LCSC; Category: Capacitors - MLCC; Supplier Part Number 1: C106099; Tolerance: ±5%; Voltage Rating: 1kV; Temperature Coefficient: C0G; RoHS: Yes; ComponentLink1Description: Datasheet; ComponentLink1URL: https://wmsc.lcsc.com/wmsc/upload/file/pdf/v2/lcsc/2304140030_IHHEC-HOLY-STONE-ENTERPRISE-CO---LTD-C1210N561J102T_C106099.pdf; ComponentLink2Description: JLCPCB Part URL; ComponentLink2URL: https://jlcpcb.com/partdetail/C106099; ComponentLink3Description: LCSC Part URL; ComponentLink3URL: https://lcsc.com/product-detail/Multilayer-Ceramic-Capacitors-MLCC---SMD-SMT_IHHECHOLY-STONE-ENTERPRISE-CO.%2C-LTD-IHHECHOLY-STONE-ENTERPRISE-CO.%2C-LTD-C1210N561J102T_C106099.html
footprint CAP-1210 (1210 (3225M) Capacitor)
pins: 1, 2

## C1210N682J631TF
designator C?  Capacitance: 6.8nF  (hidden comment: *)
Capacitor, Ceramic (MLCC), 6.8nF, 630V, NP0, SMD 1210; Manufacturer: IHHEC(HOLY STONE ENTERPRISE CO., LTD); Manufacturer Part Number: C1210N682J631TF; Package Size: 1210; JLCPCB Basic Part: No; JLCPCB Part Number: C2991904; Supplier 1: LCSC; Category: Capacitors - MLCC; Supplier Part Number 1: C2991904; Voltage Rating: 630V; Temperature Coefficient: NP0; RoHS: Yes; ComponentLink1Description: Datasheet; ComponentLink1URL: https://wmsc.lcsc.com/wmsc/upload/file/pdf/v2/lcsc/2204220915_IHHEC-HOLY-STONE-ENTERPRISE-CO---LTD-C1210N682J631TF_C2991904.pdf; ComponentLink2Description: JLCPCB Part URL; ComponentLink2URL: https://jlcpcb.com/partdetail/C2991904; ComponentLink3Description: LCSC Part URL; ComponentLink3URL: https://lcsc.com/product-detail/Multilayer-Ceramic-Capacitors-MLCC---SMD-SMT_IHHECHOLY-STONE-ENTERPRISE-CO.%2C-LTD-IHHECHOLY-STONE-ENTERPRISE-CO.%2C-LTD-C1210N682J631TF_C2991904.html
footprint CAP-1210 (1210 (3225M) Capacitor)
pins: 1, 2

## C1210P224K451TFF
designator C?  Capacitance: 220nF  (hidden comment: *)
Capacitor, Ceramic (MLCC), 220nF, ±10%, 450V, ±10%, SMD 1210; Manufacturer: IHHEC(HOLY STONE ENTERPRISE CO., LTD); Manufacturer Part Number: C1210P224K451TFF; Package Size: 1210; JLCPCB Basic Part: No; JLCPCB Part Number: C340320; Supplier 1: LCSC; Category: Capacitors - MLCC; Supplier Part Number 1: C340320; Tolerance: ±10%; Voltage Rating: 450V; RoHS: Yes; ComponentLink1Description: Datasheet; ComponentLink1URL: https://wmsc.lcsc.com/wmsc/upload/file/pdf/v2/lcsc/2005211105_IHHEC-HOLY-STONE-ENTERPRISE-CO---LTD-C1210P224K451TFF_C340320.pdf; ComponentLink2Description: JLCPCB Part URL; ComponentLink2URL: https://jlcpcb.com/partdetail/C340320; ComponentLink3Description: LCSC Part URL; ComponentLink3URL: https://lcsc.com/product-detail/Multilayer-Ceramic-Capacitors-MLCC---SMD-SMT_IHHECHOLY-STONE-ENTERPRISE-CO.%2C-LTD-IHHECHOLY-STONE-ENTERPRISE-CO.%2C-LTD-C1210P224K451TFF_C340320.html
footprint CAP-1210 (1210 (3225M) Capacitor)
pins: 1, 2

## C1210V683KBRAC7800
designator C?  Capacitance: 68nF  (hidden comment: *)
Capacitor, Ceramic (MLCC), 68nF, ±10%, 630V, X7R, ±10%, SMD 1210; Manufacturer: KEMET; Manufacturer Part Number: C1210V683KBRAC7800; Package Size: 1210; JLCPCB Basic Part: No; JLCPCB Part Number: C141233; Supplier 1: LCSC; Category: Capacitors - MLCC; Supplier Part Number 1: C141233; Tolerance: ±10%; Voltage Rating: 630V; Temperature Coefficient: X7R; RoHS: Yes; ComponentLink1Description: Datasheet; ComponentLink1URL: https://wmsc.lcsc.com/wmsc/upload/file/pdf/v2/lcsc/1809191841_KEMET-C1210V683KBRAC7800_C141233.pdf; ComponentLink2Description: JLCPCB Part URL; ComponentLink2URL: https://jlcpcb.com/partdetail/C141233; ComponentLink3Description: LCSC Part URL; ComponentLink3URL: https://lcsc.com/product-detail/Multilayer-Ceramic-Capacitors-MLCC---SMD-SMT_KEMET-KEMET-C1210V683KBRAC7800_C141233.html
footprint CAP-1210 (1210 (3225M) Capacitor)
pins: 1, 2

## C1210X5R226K250NT
designator C?  Capacitance: 22uF  (hidden comment: *)
Capacitor, Ceramic (MLCC), 22uF, ±10%, 25V, ±10%, SMD 1210; Manufacturer: SANYEAR; Manufacturer Part Number: C1210X5R226K250NT; Package Size: 1210; JLCPCB Basic Part: No; JLCPCB Part Number: C2835524; Supplier 1: LCSC; Category: Capacitors - MLCC; Supplier Part Number 1: C2835524; Tolerance: ±10%; Voltage Rating: 25V; RoHS: Yes; ComponentLink1Description: Datasheet; ComponentLink1URL: https://wmsc.lcsc.com/wmsc/upload/file/pdf/v2/lcsc/2304140030_SANYEAR-C1210X5R226K250NT_C2835524.pdf; ComponentLink2Description: JLCPCB Part URL; ComponentLink2URL: https://jlcpcb.com/partdetail/C2835524; ComponentLink3Description: LCSC Part URL; ComponentLink3URL: https://lcsc.com/product-detail/Multilayer-Ceramic-Capacitors-MLCC---SMD-SMT_SANYEAR-SANYEAR-C1210X5R226K250NT_C2835524.html
footprint CAP-1210 (1210 (3225M) Capacitor)
pins: 1, 2

## C1210X6S226K250NT
designator C?  Capacitance: 22uF  (hidden comment: *)
Capacitor, Ceramic (MLCC), 22uF, ±10%, 25V, ±10%, SMD 1210; Manufacturer: SANYEAR; Manufacturer Part Number: C1210X6S226K250NT; Package Size: 1210; JLCPCB Basic Part: No; JLCPCB Part Number: C2844309; Supplier 1: LCSC; Category: Capacitors - MLCC; Supplier Part Number 1: C2844309; Tolerance: ±10%; Voltage Rating: 25V; RoHS: Yes; ComponentLink1Description: Datasheet; ComponentLink1URL: https://wmsc.lcsc.com/wmsc/upload/file/pdf/v2/lcsc/2304140030_SANYEAR-C1210X6S226K250NT_C2844309.pdf; ComponentLink2Description: JLCPCB Part URL; ComponentLink2URL: https://jlcpcb.com/partdetail/C2844309; ComponentLink3Description: LCSC Part URL; ComponentLink3URL: https://lcsc.com/product-detail/Multilayer-Ceramic-Capacitors-MLCC---SMD-SMT_SANYEAR-SANYEAR-C1210X6S226K250NT_C2844309.html
footprint CAP-1210 (1210 (3225M) Capacitor)
pins: 1, 2

## C1210X7R106K500NT
designator C?  Capacitance: 10uF  (hidden comment: *)
Capacitor, Ceramic (MLCC), 10uF, 50V, SMD 1210; Manufacturer: SANYEAR; Manufacturer Part Number: C1210X7R106K500NT; Package Size: 1210; JLCPCB Basic Part: No; JLCPCB Part Number: C2835519; Supplier 1: LCSC; Category: Capacitors - MLCC; Supplier Part Number 1: C2835519; Voltage Rating: 50V; RoHS: Yes; ComponentLink1Description: Datasheet; ComponentLink1URL: https://wmsc.lcsc.com/wmsc/upload/file/pdf/v2/lcsc/2304140030_SANYEAR-C1210X7R106K500NT_C2835519.pdf; ComponentLink2Description: JLCPCB Part URL; ComponentLink2URL: https://jlcpcb.com/partdetail/C2835519; ComponentLink3Description: LCSC Part URL; ComponentLink3URL: https://lcsc.com/product-detail/Multilayer-Ceramic-Capacitors-MLCC---SMD-SMT_SANYEAR-SANYEAR-C1210X7R106K500NT_C2835519.html
footprint CAP-1210 (1210 (3225M) Capacitor)
pins: 1, 2

## C1210X7R106M500NT
designator C?  Capacitance: 10uF  (hidden comment: *)
Capacitor, Ceramic (MLCC), 10uF, ±20%, 50V, ±20%, SMD 1210; Manufacturer: SANYEAR; Manufacturer Part Number: C1210X7R106M500NT; Package Size: 1210; JLCPCB Basic Part: No; JLCPCB Part Number: C2835522; Supplier 1: LCSC; Category: Capacitors - MLCC; Supplier Part Number 1: C2835522; Tolerance: ±20%; Voltage Rating: 50V; RoHS: Yes; ComponentLink1Description: Datasheet; ComponentLink1URL: https://wmsc.lcsc.com/wmsc/upload/file/pdf/v2/lcsc/2304140030_SANYEAR-C1210X7R106M500NT_C2835522.pdf; ComponentLink2Description: JLCPCB Part URL; ComponentLink2URL: https://jlcpcb.com/partdetail/C2835522; ComponentLink3Description: LCSC Part URL; ComponentLink3URL: https://lcsc.com/product-detail/Multilayer-Ceramic-Capacitors-MLCC---SMD-SMT_SANYEAR-SANYEAR-C1210X7R106M500NT_C2835522.html
footprint CAP-1210 (1210 (3225M) Capacitor)
pins: 1, 2

## C1210X7R226K160NT
designator C?  Capacitance: 22uF  (hidden comment: *)
Capacitor, Ceramic (MLCC), 22uF, 16V, SMD 1210; Manufacturer: SANYEAR; Manufacturer Part Number: C1210X7R226K160NT; Package Size: 1210; JLCPCB Basic Part: No; JLCPCB Part Number: C2835525; Supplier 1: LCSC; Category: Capacitors - MLCC; Supplier Part Number 1: C2835525; Voltage Rating: 16V; RoHS: Yes; ComponentLink1Description: Datasheet; ComponentLink1URL: https://wmsc.lcsc.com/wmsc/upload/file/pdf/v2/lcsc/2304140030_SANYEAR-C1210X7R226K160NT_C2835525.pdf; ComponentLink2Description: JLCPCB Part URL; ComponentLink2URL: https://jlcpcb.com/partdetail/C2835525; ComponentLink3Description: LCSC Part URL; ComponentLink3URL: https://lcsc.com/product-detail/Multilayer-Ceramic-Capacitors-MLCC---SMD-SMT_SANYEAR-SANYEAR-C1210X7R226K160NT_C2835525.html
footprint CAP-1210 (1210 (3225M) Capacitor)
pins: 1, 2

## C1210X7S475K101NT
designator C?  Capacitance: 4.7uF  (hidden comment: *)
Capacitor, Ceramic (MLCC), 4.7uF, 100V, X7S, SMD 1210; Manufacturer: SANYEAR; Manufacturer Part Number: C1210X7S475K101NT; Package Size: 1210; JLCPCB Basic Part: No; JLCPCB Part Number: C2859191; Supplier 1: LCSC; Category: Capacitors - MLCC; Supplier Part Number 1: C2859191; Voltage Rating: 100V; Temperature Coefficient: X7S; RoHS: Yes; ComponentLink1Description: Datasheet; ComponentLink1URL: https://wmsc.lcsc.com/wmsc/upload/file/pdf/v2/lcsc/2108301930_SANYEAR-C1210X7S475K101NT_C2859191.pdf; ComponentLink2Description: JLCPCB Part URL; ComponentLink2URL: https://jlcpcb.com/partdetail/C2859191; ComponentLink3Description: LCSC Part URL; ComponentLink3URL: https://lcsc.com/product-detail/Multilayer-Ceramic-Capacitors-MLCC---SMD-SMT_SANYEAR-SANYEAR-C1210X7S475K101NT_C2859191.html
footprint CAP-1210 (1210 (3225M) Capacitor)
pins: 1, 2

## C1210X7S475M101NT
designator C?  Capacitance: 4.7uF  (hidden comment: *)
Capacitor, Ceramic (MLCC), 4.7uF, 100V, X7S, SMD 1210; Manufacturer: SANYEAR; Manufacturer Part Number: C1210X7S475M101NT; Package Size: 1210; JLCPCB Basic Part: No; JLCPCB Part Number: C2859190; Supplier 1: LCSC; Category: Capacitors - MLCC; Supplier Part Number 1: C2859190; Voltage Rating: 100V; Temperature Coefficient: X7S; RoHS: Yes; ComponentLink1Description: Datasheet; ComponentLink1URL: https://wmsc.lcsc.com/wmsc/upload/file/pdf/v2/lcsc/2108301930_SANYEAR-C1210X7S475M101NT_C2859190.pdf; ComponentLink2Description: JLCPCB Part URL; ComponentLink2URL: https://jlcpcb.com/partdetail/C2859190; ComponentLink3Description: LCSC Part URL; ComponentLink3URL: https://lcsc.com/product-detail/Multilayer-Ceramic-Capacitors-MLCC---SMD-SMT_SANYEAR-SANYEAR-C1210X7S475M101NT_C2859190.html
footprint CAP-1210 (1210 (3225M) Capacitor)
pins: 1, 2

## C1210X102K102T
designator C?  Capacitance: 1nF  (hidden comment: *)
Capacitor, Ceramic (MLCC), 1nF, ±10%, 1kV, X7R, ±10%, SMD 1210; Manufacturer: IHHEC(HOLY STONE ENTERPRISE CO., LTD); Manufacturer Part Number: C1210X102K102T; Package Size: 1210; JLCPCB Basic Part: No; JLCPCB Part Number: C106100; Supplier 1: LCSC; Category: Capacitors - MLCC; Supplier Part Number 1: C106100; Tolerance: ±10%; Voltage Rating: 1kV; Temperature Coefficient: X7R; RoHS: Yes; ComponentLink1Description: Datasheet; ComponentLink1URL: https://wmsc.lcsc.com/wmsc/upload/file/pdf/v2/lcsc/2304140030_IHHEC-HOLY-STONE-ENTERPRISE-CO---LTD-C1210X102K102T_C106100.pdf; ComponentLink2Description: JLCPCB Part URL; ComponentLink2URL: https://jlcpcb.com/partdetail/C106100; ComponentLink3Description: LCSC Part URL; ComponentLink3URL: https://lcsc.com/product-detail/Multilayer-Ceramic-Capacitors-MLCC---SMD-SMT_IHHECHOLY-STONE-ENTERPRISE-CO.%2C-LTD-IHHECHOLY-STONE-ENTERPRISE-CO.%2C-LTD-C1210X102K102T_C106100.html
footprint CAP-1210 (1210 (3225M) Capacitor)
pins: 1, 2

## C1210X102K202T
designator C?  Capacitance: 1nF  (hidden comment: *)
Capacitor, Ceramic (MLCC), 1nF, ±10%, 2kV, X7R, ±10%, SMD 1210; Manufacturer: IHHEC(HOLY STONE ENTERPRISE CO., LTD); Manufacturer Part Number: C1210X102K202T; Package Size: 1210; JLCPCB Basic Part: No; JLCPCB Part Number: C106101; Supplier 1: LCSC; Category: Capacitors - MLCC; Supplier Part Number 1: C106101; Tolerance: ±10%; Voltage Rating: 2kV; Temperature Coefficient: X7R; RoHS: Yes; ComponentLink1Description: Datasheet; ComponentLink1URL: https://wmsc.lcsc.com/wmsc/upload/file/pdf/v2/lcsc/2304140030_IHHEC-HOLY-STONE-ENTERPRISE-CO---LTD-C1210X102K202T_C106101.pdf; ComponentLink2Description: JLCPCB Part URL; ComponentLink2URL: https://jlcpcb.com/partdetail/C106101; ComponentLink3Description: LCSC Part URL; ComponentLink3URL: https://lcsc.com/product-detail/Multilayer-Ceramic-Capacitors-MLCC---SMD-SMT_IHHECHOLY-STONE-ENTERPRISE-CO.%2C-LTD-IHHECHOLY-STONE-ENTERPRISE-CO.%2C-LTD-C1210X102K202T_C106101.html
footprint CAP-1210 (1210 (3225M) Capacitor)
pins: 1, 2

## C1210X102K202TDF
designator C?  Capacitance: 1nF  (hidden comment: *)
Capacitor, Ceramic (MLCC), 1nF, ±10%, 2kV, X7R, ±10%, SMD 1210; Manufacturer: IHHEC(HOLY STONE ENTERPRISE CO., LTD); Manufacturer Part Number: C1210X102K202TDF; Package Size: 1210; JLCPCB Basic Part: No; JLCPCB Part Number: C2991916; Supplier 1: LCSC; Category: Capacitors - MLCC; Supplier Part Number 1: C2991916; Tolerance: ±10%; Voltage Rating: 2kV; Temperature Coefficient: X7R; RoHS: Yes; ComponentLink1Description: Datasheet; ComponentLink1URL: https://wmsc.lcsc.com/wmsc/upload/file/pdf/v2/lcsc/2204131745_IHHEC-HOLY-STONE-ENTERPRISE-CO---LTD-C1210X102K202TDF_C2991916.pdf; ComponentLink2Description: JLCPCB Part URL; ComponentLink2URL: https://jlcpcb.com/partdetail/C2991916; ComponentLink3Description: LCSC Part URL; ComponentLink3URL: https://lcsc.com/product-detail/Multilayer-Ceramic-Capacitors-MLCC---SMD-SMT_IHHECHOLY-STONE-ENTERPRISE-CO.%2C-LTD-IHHECHOLY-STONE-ENTERPRISE-CO.%2C-LTD-C1210X102K202TDF_C2991916.html
footprint CAP-1210 (1210 (3225M) Capacitor)
pins: 1, 2

## C1210X103K102T
designator C?  Capacitance: 10nF  (hidden comment: *)
Capacitor, Ceramic (MLCC), 10nF, ±10%, 1kV, X7R, ±10%, SMD 1210; Manufacturer: IHHEC(HOLY STONE ENTERPRISE CO., LTD); Manufacturer Part Number: C1210X103K102T; Package Size: 1210; JLCPCB Basic Part: No; JLCPCB Part Number: C106102; Supplier 1: LCSC; Category: Capacitors - MLCC; Supplier Part Number 1: C106102; Tolerance: ±10%; Voltage Rating: 1kV; Temperature Coefficient: X7R; RoHS: Yes; ComponentLink1Description: Datasheet; ComponentLink1URL: https://wmsc.lcsc.com/wmsc/upload/file/pdf/v2/lcsc/2304140030_IHHEC-HOLY-STONE-ENTERPRISE-CO---LTD-C1210X103K102T_C106102.pdf; ComponentLink2Description: JLCPCB Part URL; ComponentLink2URL: https://jlcpcb.com/partdetail/C106102; ComponentLink3Description: LCSC Part URL; ComponentLink3URL: https://lcsc.com/product-detail/Multilayer-Ceramic-Capacitors-MLCC---SMD-SMT_IHHECHOLY-STONE-ENTERPRISE-CO.%2C-LTD-IHHECHOLY-STONE-ENTERPRISE-CO.%2C-LTD-C1210X103K102T_C106102.html
footprint CAP-1210 (1210 (3225M) Capacitor)
pins: 1, 2

## C1210X103K202T
designator C?  Capacitance: 10nF  (hidden comment: *)
Capacitor, Ceramic (MLCC), 10nF, 2kV, X7R, SMD 1210; Manufacturer: IHHEC(HOLY STONE ENTERPRISE CO., LTD); Manufacturer Part Number: C1210X103K202T; Package Size: 1210; JLCPCB Basic Part: No; JLCPCB Part Number: C2915763; Supplier 1: LCSC; Category: Capacitors - MLCC; Supplier Part Number 1: C2915763; Voltage Rating: 2kV; Temperature Coefficient: X7R; RoHS: Yes; ComponentLink1Description: Datasheet; ComponentLink1URL: https://wmsc.lcsc.com/wmsc/upload/file/pdf/v2/lcsc/2111172030_IHHEC-HOLY-STONE-ENTERPRISE-CO---LTD-C1210X103K202T_C2915763.pdf; ComponentLink2Description: JLCPCB Part URL; ComponentLink2URL: https://jlcpcb.com/partdetail/C2915763; ComponentLink3Description: LCSC Part URL; ComponentLink3URL: https://lcsc.com/product-detail/Multilayer-Ceramic-Capacitors-MLCC---SMD-SMT_IHHECHOLY-STONE-ENTERPRISE-CO.%2C-LTD-IHHECHOLY-STONE-ENTERPRISE-CO.%2C-LTD-C1210X103K202T_C2915763.html
footprint CAP-1210 (1210 (3225M) Capacitor)
pins: 1, 2

## C1210X103K202TEF
designator C?  Capacitance: 10nF  (hidden comment: *)
Capacitor, Ceramic (MLCC), 10nF, ±10%, 2kV, X7R, ±10%, SMD 1210; Manufacturer: IHHEC(HOLY STONE ENTERPRISE CO., LTD); Manufacturer Part Number: C1210X103K202TEF; Package Size: 1210; JLCPCB Basic Part: No; JLCPCB Part Number: C915834; Supplier 1: LCSC; Category: Capacitors - MLCC; Supplier Part Number 1: C915834; Tolerance: ±10%; Voltage Rating: 2kV; Temperature Coefficient: X7R; RoHS: Yes; ComponentLink1Description: Datasheet; ComponentLink1URL: https://wmsc.lcsc.com/wmsc/upload/file/pdf/v2/lcsc/2403211046_IHHEC-HOLY-STONE-ENTERPRISE-CO---LTD-C1210X103K202TEF_C915834.pdf; ComponentLink2Description: JLCPCB Part URL; ComponentLink2URL: https://jlcpcb.com/partdetail/C915834; ComponentLink3Description: LCSC Part URL; ComponentLink3URL: https://lcsc.com/product-detail/Multilayer-Ceramic-Capacitors-MLCC---SMD-SMT_IHHECHOLY-STONE-ENTERPRISE-CO.%2C-LTD-IHHECHOLY-STONE-ENTERPRISE-CO.%2C-LTD-C1210X103K202TEF_C915834.html
footprint CAP-1210 (1210 (3225M) Capacitor)
pins: 1, 2

## C1210X104K251T
designator C?  Capacitance: 100nF  (hidden comment: *)
Capacitor, Ceramic (MLCC), 100nF, ±10%, 250V, X7R, ±10%, SMD 1210; Manufacturer: IHHEC(HOLY STONE ENTERPRISE CO., LTD); Manufacturer Part Number: C1210X104K251T; Package Size: 1210; JLCPCB Basic Part: No; JLCPCB Part Number: C106103; Supplier 1: LCSC; Category: Capacitors - MLCC; Supplier Part Number 1: C106103; Tolerance: ±10%; Voltage Rating: 250V; Temperature Coefficient: X7R; RoHS: Yes; ComponentLink1Description: Datasheet; ComponentLink1URL: https://wmsc.lcsc.com/wmsc/upload/file/pdf/v2/lcsc/2304140030_IHHEC-HOLY-STONE-ENTERPRISE-CO---LTD-C1210X104K251T_C106103.pdf; ComponentLink2Description: JLCPCB Part URL; ComponentLink2URL: https://jlcpcb.com/partdetail/C106103; ComponentLink3Description: LCSC Part URL; ComponentLink3URL: https://lcsc.com/product-detail/Multilayer-Ceramic-Capacitors-MLCC---SMD-SMT_IHHECHOLY-STONE-ENTERPRISE-CO.%2C-LTD-IHHECHOLY-STONE-ENTERPRISE-CO.%2C-LTD-C1210X104K251T_C106103.html
footprint CAP-1210 (1210 (3225M) Capacitor)
pins: 1, 2